# Altium footprint library BluetoothAdapter.PcbLib: 37 footprints (part 3 of 3)
Each footprint in its own frame and in the unit in brackets; x right, y up, seen from the top. Pads: shape width x height; smd on the part's side, far side on the other; paste and mask are expansions set on the pad; w line width, h text height; cw(c..) or ccw(c..) is an arc to the next point about the centre after c.
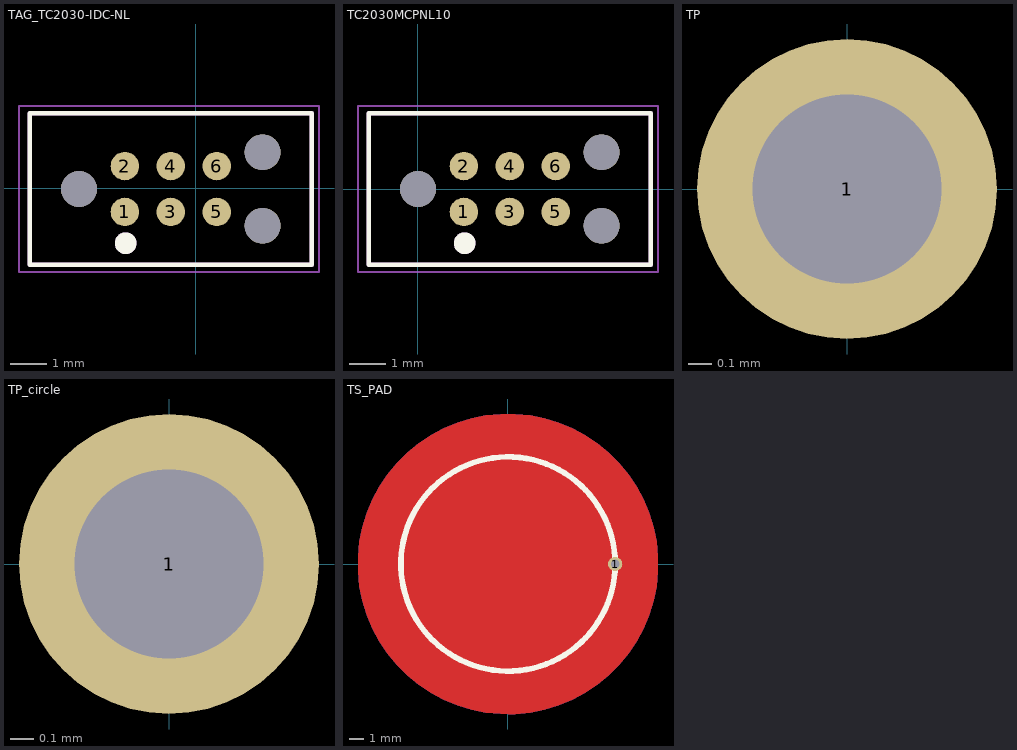
[diagram p2: the footprints below, top view; thin cyan lines are the x and y axes]

## TAG_TC2030-IDC-NL [mm]
pads (9):
  round 0.787 smd paste-1: 1(-1.961,-0.66) 2(-1.961,0.61) 3(-0.691,-0.66) 4(-0.691,0.61) 5(0.579,-0.66) 6(0.579,0.61)
  round 0.991 hole 0.991 unplated: ""(-3.231,-0.025) ""(1.849,-1.041) ""(1.849,0.991)
Top Overlay:
  circle w0.3: c-1.941,-1.525 r0.15
  lines w0.127: -4.591,-2.125 3.209,-2.125 3.209,2.075 -4.591,2.075 -4.591,-2.125
Mechanical 13:
  circle w0.3: c-1.941,-1.525 r0.15
  lines w0.127: -4.591,-2.125 -4.591,2.075 3.209,2.075 3.209,-2.125 -4.591,-2.125
Mechanical 15:
  lines w0.05: -4.891,-2.325 -4.891,2.275 3.409,2.275 3.409,-2.325 -4.891,-2.325

## TC2030MCPNL10 [mil]
height 70.87
pads (9):
  round 30.98 smd paste-39.37: 1(50,-25) 2(50,25) 3(100,-25) 4(100,25) 5(150,-25) 6(150,25)
  round 39.02 hole 39.02 unplated: ""(0,0) ""(200,-40) ""(200,40)
Top Overlay:
  circle w11.81: c50.79,-59.06 r5.91
  lines w5: -53.54,-82.68 253.54,-82.68 253.54,82.68 -53.54,82.68 -53.54,-82.68
Mechanical 13:
  circle w11.81: c50.79,-59.06 r5.91
  lines w5: -53.54,-82.68 -53.54,82.68 253.54,82.68 253.54,-82.68 -53.54,-82.68
Mechanical 15:
  lines w1.97: -65.35,-90.55 -65.35,90.55 261.42,90.55 261.42,-90.55 -65.35,-90.55

## TP [mm]
pads (1):
  round 1.27 hole 0.8: 1(0,0)

## TP_circle [mm]
pads (1):
  round 1.27 hole 0.8: 1(0,0)
3D body "User Library-Test Point Keystone - 5000 RED.STEP": height 4.57, standoff -3.05, extent -1.27,-1.27 1.27,1.27

## TS_PAD [mm]
height 1.8
pads (1):
  round 1 hole 0.6 mask+0.102: 1(7.507,0.035)
Top Layer:
  region: 0.007,7.535 -0.361,7.535 -1.095,7.463 -1.818,7.319 -2.523,7.105 -3.204,6.823 -3.853,6.476 -4.466,6.066 -5.036,5.599 -5.557,5.078 -6.024,4.508 -6.434,3.895 -6.781,3.246 -7.063,2.565 -7.277,1.86 -7.421,1.137 -7.493,0.403 -7.493,0.035 -7.493,-0.333 -7.421,-1.067 -7.277,-1.79 -7.063,-2.495 -6.781,-3.176 -6.434,-3.825 -6.024,-4.438 -5.557,-5.008 -5.036,-5.529 -4.466,-5.996 -3.853,-6.406 -3.204,-6.753 -2.523,-7.035 -1.818,-7.249 -1.095,-7.393 -0.361,-7.465 0.007,-7.465 0.375,-7.465 1.109,-7.393 1.832,-7.249 2.537,-7.035 3.218,-6.753 3.867,-6.406 4.48,-5.996 5.05,-5.529 5.571,-5.008 6.038,-4.438 6.448,-3.825 6.795,-3.176 7.077,-2.495 7.291,-1.79 7.435,-1.067 7.507,-0.333 7.507,0.035 7.507,0.403 7.435,1.137 7.291,1.86 7.077,2.565 6.795,3.246 6.448,3.895 6.038,4.508 5.571,5.078 5.05,5.599 4.48,6.066 3.867,6.476 3.218,6.823 2.537,7.105 1.832,7.319 1.109,7.463 0.375,7.535
  pour cut-out: 0.007,-10.465 0.523,-10.465 1.55,-10.364 2.561,-10.163 3.549,-9.863 4.502,-9.468 5.412,-8.982 6.269,-8.409 7.067,-7.754 7.796,-7.025 8.451,-6.227 9.024,-5.37 9.51,-4.46 9.905,-3.507 10.205,-2.519 10.406,-1.508 10.507,-0.481 10.507,0.035 10.507,0.551 10.406,1.578 10.205,2.589 9.905,3.577 9.51,4.53 9.024,5.44 8.451,6.297 7.796,7.095 7.067,7.824 6.269,8.479 5.412,9.052 4.502,9.538 3.549,9.933 2.561,10.233 1.55,10.434 0.523,10.535 0.007,10.535 -0.509,10.535 -1.536,10.434 -2.547,10.233 -3.535,9.933 -4.488,9.538 -5.398,9.052 -6.255,8.479 -7.053,7.824 -7.782,7.095 -8.437,6.297 -9.01,5.44 -9.496,4.53 -9.891,3.577 -10.191,2.589 -10.392,1.578 -10.493,0.551 -10.493,0.035 -10.493,-0.481 -10.392,-1.508 -10.191,-2.519 -9.891,-3.507 -9.496,-4.46 -9.01,-5.37 -8.437,-6.227 -7.782,-7.025 -7.053,-7.754 -6.255,-8.409 -5.398,-8.982 -4.488,-9.468 -3.535,-9.863 -2.547,-10.163 -1.536,-10.364 -0.509,-10.465
Bottom Layer:
  pour cut-out: 0.007,-10.465 0.523,-10.465 1.55,-10.364 2.561,-10.163 3.549,-9.863 4.502,-9.468 5.412,-8.982 6.269,-8.409 7.067,-7.754 7.796,-7.025 8.451,-6.227 9.024,-5.37 9.51,-4.46 9.905,-3.507 10.205,-2.519 10.406,-1.508 10.507,-0.481 10.507,0.035 10.507,0.551 10.406,1.578 10.205,2.589 9.905,3.577 9.51,4.53 9.024,5.44 8.451,6.297 7.796,7.095 7.067,7.824 6.269,8.479 5.412,9.052 4.502,9.538 3.549,9.933 2.561,10.233 1.55,10.434 0.523,10.535 0.007,10.535 -0.509,10.535 -1.536,10.434 -2.547,10.233 -3.535,9.933 -4.488,9.538 -5.398,9.052 -6.255,8.479 -7.053,7.824 -7.782,7.095 -8.437,6.297 -9.01,5.44 -9.496,4.53 -9.891,3.577 -10.191,2.589 -10.392,1.578 -10.493,0.551 -10.493,0.035 -10.493,-0.481 -10.392,-1.508 -10.191,-2.519 -9.891,-3.507 -9.496,-4.46 -9.01,-5.37 -8.437,-6.227 -7.782,-7.025 -7.053,-7.754 -6.255,-8.409 -5.398,-8.982 -4.488,-9.468 -3.535,-9.863 -2.547,-10.163 -1.536,-10.364 -0.509,-10.465
Top Overlay:
  circle w0.4: c0.007,0.035 r7.5